# Altium footprint library Module MISC.PcbLib: 27 footprints (part 2 of 2)
Each footprint in its own frame and in the unit in brackets; x right, y up, seen from the top. Pads: shape width x height; smd on the part's side, far side on the other; paste and mask are expansions set on the pad; w line width, h text height; cw(c..) or ccw(c..) is an arc to the next point about the centre after c.
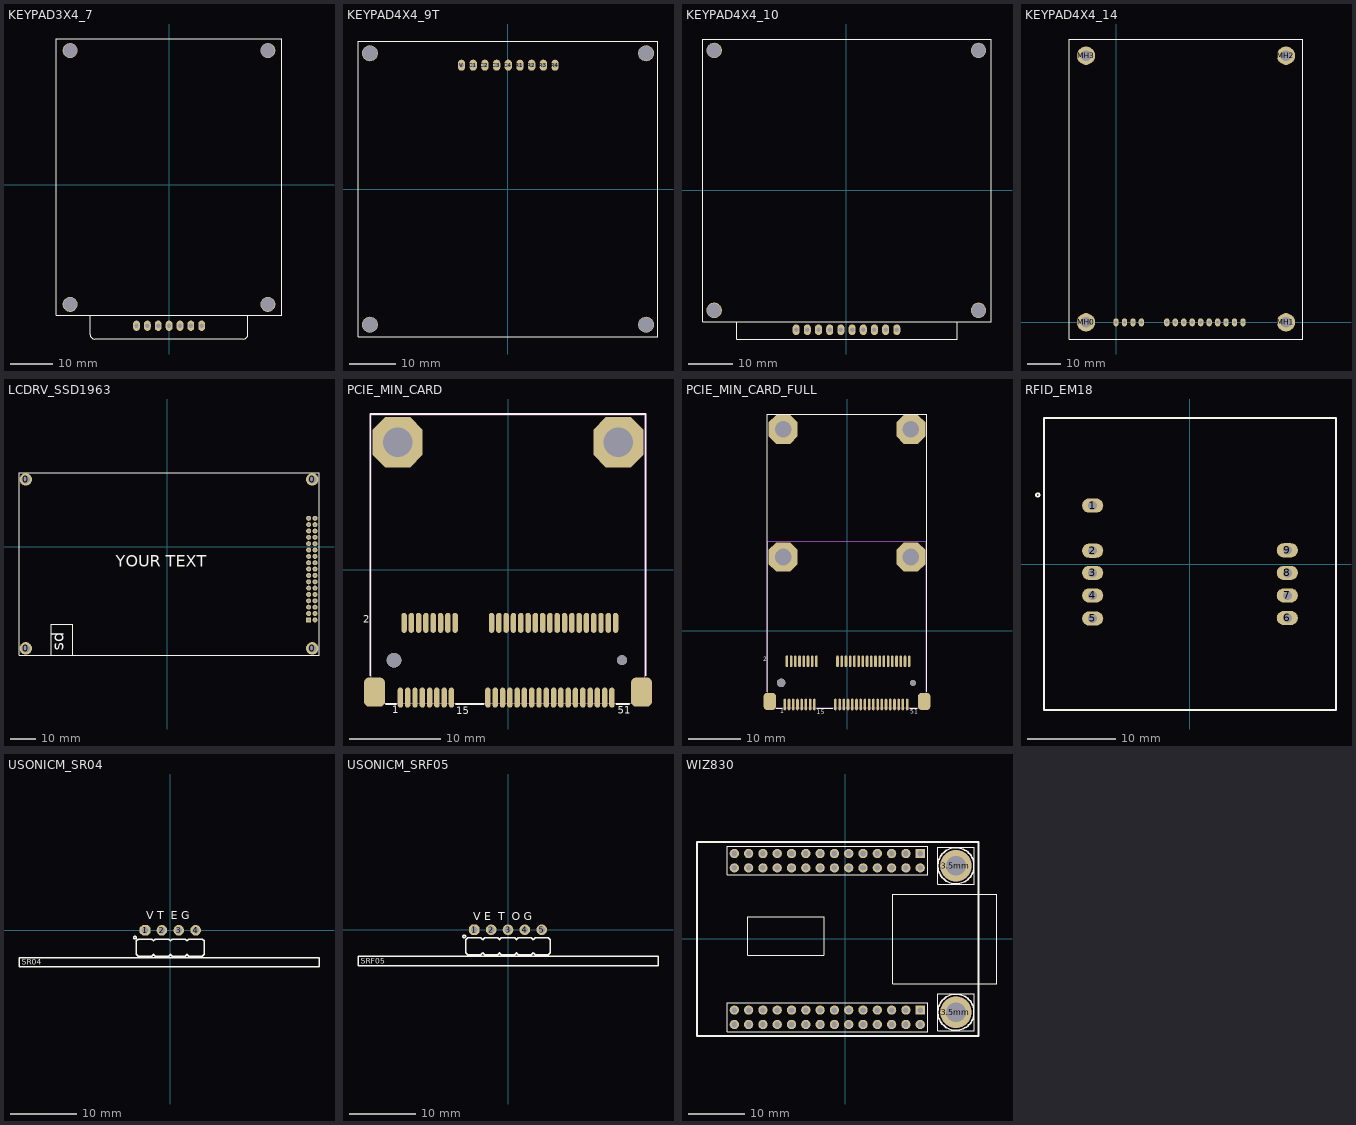
[diagram p1: the footprints below, top view; thin cyan lines are the x and y axes]

## KEYPAD3X4_7 [mm] "Matrix Keyboard 4x4"
pads (11):
  oval 1.6x2.4 hole 1: C1(-7.6,-32.9) C2(-5.06,-32.9) C3(-2.52,-32.9) R1(0.02,-32.9) R2(2.56,-32.9) R3(5.1,-32.9) R4(7.64,-32.9)
  round 3.5 / inner round 3.5 / far side round 5.5 hole 3.2: ""(-23.1,-27.9) ""(-23.1,31.4) ""(23.1,-27.9) ""(23.1,31.4)
Top Overlay:
  lines w0.2: -18.4,-30.4 -18.4,-35 ccw(c-17.4,-35) -17.4,-36 17.4,-36 ccw(c17.4,-35) 18.4,-35 18.4,-30.4 ; -26.3,-30.4 26.3,-30.4 26.3,34.1 -26.3,34.1 -26.3,-30.4
3D body "User Library-Keypad 3x4.step": height 10.8, standoff -12, extent -26.175,-35.8 26.176,33.95

## KEYPAD4X4_9T [mm] "Matrix Keyboard 4x4"
pads (13):
  oval 1.6x2.4 hole 1: C1(-7.56,26.9) C2(-5.02,26.9) C3(-2.48,26.9) C4(0.06,26.9) R1(2.6,26.9) R2(5.14,26.9) R3(7.68,26.9) R4(10.22,26.9) V(-10.1,26.9)
  round 3.5 / inner round 3.5 / far side round 5.5 hole 3.2: ""(-30,-29.5) ""(-30,29.5) ""(30,-29.5) ""(30,29.5)
Top Overlay:
  lines w0.2: -32.6,-32.1 32.6,-32.1 32.6,32.1 -32.6,32.1 -32.6,-32.1
3D body "43128.stp": height 13.17, standoff -7.7, extent -32.5,-32 32.5,32

## KEYPAD4X4_10 [mm] "Matrix Keyboard 4x4"
pads (14):
  oval 1.6x2.4 hole 1: C1(-8.86,-31.7) C2(-6.32,-31.7) C3(-3.78,-31.7) C4(-1.24,-31.7) R1(1.3,-31.7) R2(3.84,-31.7) R3(6.38,-31.7) R4(8.92,-31.7) ""(-11.4,-31.7) ""(11.46,-31.7)
  round 3.5 / inner round 3.5 / far side round 5.5 hole 3.2: ""(-30,-27.3) ""(-30,31.7) ""(30,-27.3) ""(30,31.7)
Top Overlay:
  lines w0.2: -24.9,-29.9 -24.9,-33.8 25.2,-33.8 25.2,-29.9 ; -32.6,-29.9 -32.6,34.3 32.9,34.3 32.9,-29.9 -32.6,-29.9
3D body "User Library-Keypad 4x4.step": height 12.08, standoff 2.68, extent -32.539,-33.6 32.739,34.218

## KEYPAD4X4_14 [mm] "Matrix Keyboard 4x4"
pads (18):
  oval 1.6x2.4 hole 1: C1(17.78,0) C2(20.32,0) C3(22.86,0) C4(25.4,0) COM(38.1,0) L1(27.94,0) L2(30.48,0) L3(33.02,0) L4(35.56,0) R1(0,0) R2(2.54,0) R3(5.08,0) R4(7.62,0) V(15.24,0)
  round 5.5 hole 3.2: MH0(-9,0) MH1(51,0) MH2(51,80) MH3(-9,80)
Top Overlay:
  lines w0.2: -14,-5 -14,85 56,85 56,-5 -14,-5
3D body "header04-15mm.STEP": height 18.03, standoff -2.54, extent -1.27,-1.27 8.89,1.27
3D body "header10-15mm.STEP": height 18.03, standoff -2.54, extent 13.97,-1.27 39.37,1.27
3D body "Spacer.STEP": height 15, standoff -5, extent -11.858,77.525 -6.142,82.475
3D body "Spacer.STEP": height 15, standoff -5, extent -11.858,-2.475 -6.142,2.475
3D body "Spacer.STEP": height 15, standoff -5, extent 48.142,-2.475 53.858,2.475
3D body "Spacer.STEP": height 15, standoff -5, extent 48.142,77.525 53.858,82.475
3D body "Keyboard.STEP": height 22.22, standoff 15, extent -14,-5 56,85

## LCDRV_SSD1963 [mm] "SSD1963 Module.3 Or 5 Inch"
pads (38):
  round 5 hole 3.2: 0(-56.6,-40.7) 0(-56.6,26.9) 0(58,-40.7) 0(58,26.9)
  rect 2x2 hole 0.9: 1(56.56,-29.3)
  round 2 hole 0.9: 2(59.1,-29.3) 3(56.56,-26.76) 4(59.1,-26.76) 5(56.56,-24.22) 6(59.1,-24.22) 7(56.56,-21.68) 8(59.1,-21.68) 9(56.56,-19.14) 10(59.1,-19.14) 11(56.56,-16.6) 12(59.1,-16.6) 13(56.56,-14.06) 14(59.1,-14.06) 15(56.56,-11.52) 16(59.1,-11.52) 17(56.56,-8.98) 18(59.1,-8.98) 19(56.56,-6.44) 20(59.1,-6.44) 21(56.56,-3.9) 22(59.1,-3.9) 23(56.56,-1.36) 24(59.1,-1.36) 25(56.56,1.18) 26(59.1,1.18) 27(56.56,3.72) 28(59.1,3.72) 29(56.56,6.26) 30(59.1,6.26) 31(56.56,8.8) 32(59.1,8.8) 33(56.56,11.34) 34(59.1,11.34)
Top Overlay:
  lines w0.2: -38,-31 -37.9,-31 ; -37.9,-31 -37.9,-43.5 -46.4,-43.5 -46.4,-31 -37.9,-31
  lines w0.5: -59.3,-43.4 -59.3,29.6 60.7,29.6 60.7,-43.4 -59.3,-43.4
  text "YOUR TEXT" at -20.7,-9.6 h8
  text "sd" at -39.9,-41.7 h8
3D body "Header 6.STEP": height 9.54, standoff -2, extent 57.86,-30.59 60.35,-15.35
3D body "Header 10.STEP": height 9.54, standoff -2, extent 57.86,-15.35 60.35,10.05
3D body "Header 6.STEP": height 9.54, standoff -2, extent 55.32,-30.59 57.81,-15.35
3D body "Header 10.STEP": height 9.54, standoff -2, extent 55.32,-15.35 57.81,10.05
3D body "Header 2.STEP": height 9.54, standoff -2, extent 55.29,10.14 60.37,12.63
3D body "Header 6.STEP": height 9.54, standoff -2, extent -56.4,-30.69 -53.91,-15.45
3D body "Header 10.STEP": height 9.54, standoff -2, extent -56.4,-15.45 -53.91,9.95
3D body "Header 6.STEP": height 9.54, standoff -2, extent -58.94,-30.69 -56.45,-15.45
3D body "Header 10.STEP": height 9.54, standoff -2, extent -58.94,-15.45 -56.45,9.95
3D body "Header 2.STEP": height 9.54, standoff -2, extent -58.97,10.04 -53.89,12.53

## PCIE_MIN_CARD [mm] "PCIE_MINI_CARD molex 679100002"
height 4
pads (58):
  oval 0.6x2.2 smd: 1(-11.8,-14) 2(-11.4,-5.8) 3(-11,-14) 4(-10.6,-5.8) 5(-10.2,-14) 6(-9.8,-5.8) 7(-9.4,-14) 8(-9,-5.8) 9(-8.6,-14) 10(-8.2,-5.8) 11(-7.8,-14) 12(-7.4,-5.8) 13(-7,-14) 14(-6.6,-5.8) 15(-6.2,-14) 16(-5.8,-5.8) 17(-2.2,-14) 18(-1.8,-5.8) 19(-1.4,-14) 20(-1,-5.8) 21(-0.6,-14) 22(-0.2,-5.8) 23(0.2,-14) 24(0.6,-5.8) 25(1,-14) 26(1.4,-5.8) 27(1.8,-14) 28(2.2,-5.8) 29(2.6,-14) 30(3,-5.8) 31(3.4,-14) 32(3.8,-5.8) 33(4.2,-14) 34(4.6,-5.8) 35(5,-14) 36(5.4,-5.8) 37(5.8,-14) 38(6.2,-5.8) 39(6.6,-14) 40(7,-5.8) 41(7.4,-14) 42(7.8,-5.8) 43(8.2,-14) 44(8.6,-5.8) 45(9,-14) 46(9.4,-5.8) 47(9.8,-14) 48(10.2,-5.8) 49(10.6,-14) 50(11,-5.8) 51(11.4,-14) 52(11.8,-5.8)
  rrect50% 2.311x3.2 smd: " "(-14.65,-13.4) " "(14.65,-13.4)
  round 1.6 hole 1.6 unplated: " "(-12.5,-9.9)
  oct 5.5x5.5 hole 3.2: " "(-12.1,14) " "(12.1,14)
  round 1.1 hole 1.1 unplated: " "(12.5,-9.9)
Top Overlay:
  lines w0.2: -15.1,-11.6 -15.1,17.1 15.1,17.1 15.1,-11.6 ; -13.4,-14.7 -12.3,-14.7 ; -5.7,-14.7 -2.7,-14.7 ; 11.9,-14.7 13.3,-14.7
  text "1" at -12.7,-15.7 h0.8
  text "2" at -15.9,-5.8 h0.8
  text "51" at 12.011,-15.763 h0.8
  text "15" at -5.7,-15.8 h0.8
Top Solder:
  pour cut-out: 11.756,-15.054 11.756,-12.946 -2.556,-12.946 -2.556,-15.054
  pour cut-out: -5.844,-15.054 -5.844,-12.946 -12.156,-12.946 -12.156,-15.054
  pour cut-out: -5.444,-6.854 -5.444,-4.746 -11.756,-4.746 -11.756,-6.854
  pour cut-out: 12.156,-6.854 12.156,-4.746 -2.156,-4.746 -2.156,-6.854
Mechanical 13:
  lines w0.1: -15,-14.6 15,-14.6 15,17 -15,17 -15,-14.6
3D body "K3D-MM60-52B1-E1-R2 JAE Connector Division Proprietary.STEP": height 5.95, standoff -0.75, extent -14.85,-14.9 14.85,-4.9
3D body: height 4, standoff 0, extent -15,-14.6 15,17

## PCIE_MIN_CARD_FULL [mm] "PCIE_MINI_CARD molex 679100002"
height 4
pads (60):
  oval 0.5x2.2 smd mask+0.075: 1(-11.8,-14) 2(-11.4,-5.8) 3(-11,-14) 4(-10.6,-5.8) 5(-10.2,-14) 6(-9.8,-5.8) 7(-9.4,-14) 8(-9,-5.8) 9(-8.6,-14) 10(-8.2,-5.8) 11(-7.8,-14) 12(-7.4,-5.8) 13(-7,-14) 14(-6.6,-5.8) 15(-6.2,-14) 16(-5.8,-5.8) 17(-2.2,-14) 18(-1.8,-5.8) 19(-1.4,-14) 20(-1,-5.8) 21(-0.6,-14) 22(-0.2,-5.8) 23(0.2,-14) 24(0.6,-5.8) 25(1,-14) 26(1.4,-5.8) 27(1.8,-14) 28(2.2,-5.8) 29(2.6,-14) 30(3,-5.8) 31(3.4,-14) 32(3.8,-5.8) 33(4.2,-14) 34(4.6,-5.8) 35(5,-14) 36(5.4,-5.8) 37(5.8,-14) 38(6.2,-5.8) 39(6.6,-14) 40(7,-5.8) 41(7.4,-14) 42(7.8,-5.8) 43(8.2,-14) 44(8.6,-5.8) 45(9,-14) 46(9.4,-5.8) 47(9.8,-14) 48(10.2,-5.8) 49(10.6,-14) 50(11,-5.8) 51(11.4,-14) 52(11.8,-5.8)
  rrect50% 2.311x3.2 smd: " "(-14.65,-13.4) " "(14.65,-13.4)
  round 1.6 hole 1.6 unplated: " "(-12.5,-9.9)
  round 1.1 hole 1.1 unplated: " "(12.5,-9.9)
  oct 5.5x5.5 hole 3.2 unplated: ""(-12.1,14) ""(-12.1,38.2) ""(12.1,14) ""(12.1,38.2)
Top Overlay:
  lines w0.2: -15.1,-11.6 -15.1,41.1 15.1,41.1 15.1,-11.6 ; -13.4,-14.7 -12.3,-14.7 ; -5.7,-14.7 -2.7,-14.7 ; 11.9,-14.7 13.3,-14.7
  text "15" at -5.7,-15.8 h0.8
  text "51" at 12.011,-15.763 h0.8
  text "2" at -15.9,-5.8 h0.8
  text "1" at -12.7,-15.7 h0.8
Mechanical 13:
  lines w0.1: -15,-14.6 -15,17 15,17 15,-14.6 -15,-14.6
3D body "User Library-PCI Express Mini Card (Full-Mini Card).step": height 4.8, standoff 0.05, extent -15,-9.9 15,41.05
3D body "K3D-MM60-52B1-E1-R2 JAE Connector Division Proprietary.STEP": height 5.95, standoff -0.75, extent -14.85,-14.9 14.85,-4.9

## RFID_EM18 [mm] "MODULE, RFID Reader, EM-18"
pads (9):
  oval 2.4x1.6 hole 1: 1(-11,6.65) 2(-11,1.55) 3(-11,-0.95) 4(-11,-3.5) 5(-11,-6.1) 6(11,-6.05) 7(11,-3.5) 8(11,-0.95) 9(11,1.6)
Top Overlay:
  circle w0.2: c-17.2,7.849 r0.2
  lines w0.2: -16.5,-16.45 16.5,-16.45 16.5,16.45 16.5,16.55 -16.5,16.55 -16.5,-16.45
3D body "User Library-EM-18.STEP": height 8.05, standoff -6.1, extent -16.5,-16.45 16.5,16.55

## USONICM_SR04 [mm] "Ultrasonic sensor Module, HC-SR04"
pads (4):
  oct 1.6x1.6 / inner oct 1.6x1.6 / far side oct 1.6x2.2 hole 1 mask+0.1: 1(-3.81,0)
  round 1.6 / inner round 1.6 / far side oval 1.6x2.2 hole 1 mask+0.1: 2(-1.27,0) 3(1.27,0) 4(3.81,0)
Top Overlay:
  circle w0.2: c-5.33,-1.1 r0.2
  lines w0.2: -2.57,-3.6 -2.27,-3.9 -0.27,-3.9 0.03,-3.6 ; -2.57,-1.6 -2.27,-1.3 -0.27,-1.3 0.03,-1.6 ; -2.51,-3.6 -2.81,-3.9 -4.81,-3.9 -5.11,-3.6 -5.11,-1.6 -4.81,-1.3 -2.81,-1.3 -2.51,-1.6 ; -0.03,-3.6 0.27,-3.9 2.27,-3.9 2.57,-3.6 ; -0.03,-1.6 0.27,-1.3 2.27,-1.3 2.57,-1.6 ; 2.51,-3.6 2.81,-3.9 4.81,-3.9 ; 2.51,-1.6 2.81,-1.3 4.81,-1.3 ; 4.81,-3.9 5.11,-3.6 ; 4.81,-3.9 5.11,-3.6 ; 4.81,-1.3 5.11,-1.6 ; 4.81,-1.3 5.11,-1.6 ; 5.11,-3.6 5.11,-1.6 ; -22.8,-5.5 -22.8,-4.1 22.4,-4.1 22.4,-5.5 -22.8,-5.5
  text "SR04" at -22.4,-5.2 h0.8
  text "V T  E G" at -3.63,1.7 h1.2
3D body "HC-SR04_User Library.STEP": height 20.6, standoff -4.58, extent -22.7,-17.8 22.3,0.268

## USONICM_SRF05 [mm] "Ultrasonic sensor Module, SRF05"
pads (5):
  oct 1.6x1.6 / inner oct 1.6x1.6 / far side oct 1.6x2.2 hole 1 mask+0.1: 1(-5.08,0)
  round 1.6 / inner round 1.6 / far side oval 1.6x2.2 hole 1 mask+0.1: 2(-2.54,0) 3(0,0) 4(2.54,0) 5(5.08,0)
Top Overlay:
  circle w0.2: c-6.6,-1 r0.2
  lines w0.2: -3.84,-3.5 -3.54,-3.8 -1.54,-3.8 -1.24,-3.5 ; -3.84,-1.5 -3.54,-1.2 -1.54,-1.2 -1.24,-1.5 ; -3.78,-3.5 -4.08,-3.8 -6.08,-3.8 -6.38,-3.5 -6.38,-1.5 -6.08,-1.2 -4.08,-1.2 -3.78,-1.5 ; -1.3,-3.5 -1,-3.8 1,-3.8 1.3,-3.5 ; -1.3,-1.5 -1,-1.2 1,-1.2 1.3,-1.5 ; 1.24,-3.5 1.54,-3.8 3.54,-3.8 3.84,-3.5 ; 1.24,-1.5 1.54,-1.2 3.54,-1.2 3.84,-1.5 ; 3.78,-3.5 4.08,-3.8 6.08,-3.8 6.38,-3.5 6.38,-1.5 6.08,-1.2 4.08,-1.2 3.78,-1.5 ; -22.6,-5.4 -22.6,-4 22.6,-4 22.6,-5.4 -22.6,-5.4
  text "V E  T  O G" at -5.2,1.4 h1.2
  text "SRF05" at -22.2,-5.1 h0.8
3D body "HY-SRF05_v3.stp": height 20.3, standoff -6.3, extent -22.5,-17.7 22.5,0.327

## WIZ830 [mil]
pads (58):
  round 220.47 hole 137.8: 3.5mm(775,-512.3) 3.5mm(775,512.1)
  rect 65x65 hole 39.37: J1-1(525,597.7) J2-1(525,-497.3)
  round 65 hole 39.37: J1-2(525,497.3) J1-3(425,597.7) J1-4(425,497.3) J1-5(325,597.7) J1-6(325,497.3) J1-7(225,597.7) J1-8(225,497.3) J1-9(125,597.7) J1-10(125,497.3) J1-11(25,597.7) J1-12(25,497.3) J1-13(-75,597.7) J1-14(-75,497.3) J1-15(-175,597.7) J1-16(-175,497.3) J1-17(-275,597.7) J1-18(-275,497.3) J1-19(-375,597.7) J1-20(-375,497.3) J1-21(-475,597.7) J1-22(-475,497.3) J1-23(-575,597.7) J1-24(-575,497.3) J1-25(-675,597.7) J1-26(-675,497.3) J1-27(-775,597.7) J1-28(-775,497.3) J2-2(525,-597.7) J2-3(425,-497.3) J2-4(425,-597.7) J2-5(325,-497.3) J2-6(325,-597.7) J2-7(225,-497.3) J2-8(225,-597.7) J2-9(125,-497.3) J2-10(125,-597.7) J2-11(25,-497.3) J2-12(25,-597.7) J2-13(-75,-497.3) J2-14(-75,-597.7) J2-15(-175,-497.3) J2-16(-175,-597.7) J2-17(-275,-497.3) J2-18(-275,-597.7) J2-19(-375,-497.3) J2-20(-375,-597.7) J2-21(-475,-497.3) J2-22(-475,-597.7) J2-23(-575,-497.3) J2-24(-575,-597.7) J2-25(-675,-497.3) J2-26(-675,-597.7) J2-27(-775,-497.3) J2-28(-775,-597.7)
Top Overlay:
  circle w10: c775,-512.3 r125.98
  circle w5: c774.52,-512.27 r59.06
  circle w5: c774.52,511.35 r59.06
  circle w10: c775,512.1 r125.98
  lines w5: -682.17,-113.57 -682.17,157.02 -150.68,157.02 -150.68,-113.57 -682.17,-113.57 ; 333.57,-313.45 1061.92,-313.45 1061.92,312.54 333.57,312.54 333.57,-313.45
  lines w7.87: -823.4,-647.3 576.6,-647.3 576.6,-447.3 -823.4,-447.3 -823.4,-647.3 ; -823.4,447.7 -823.4,647.7 576.6,647.7 576.6,447.7 -823.4,447.7 ; 647,-640.3 647,-384.3 903,-384.3 903,-640.3 647,-640.3 ; 647,384.1 903,384.1 903,640.1 647,640.1 647,384.1
  lines w11.81: -1036,-679.04 -1036,678.84 932,678.84 932,-679.04 -1036,-679.04
Keep-Out Layer:
  circle w39.37: c775,512.1 r78.74
Mechanical 7:
  circle w3.94: c775,512.18 r106.3
  circle w47.24: c775,512.1 r86.61
  circle w3.94: c775,-512.38 r106.3
  region: 755.28,575.09 711.97,575.09 711.97,543.59 755.28,543.59
  region: 743.49,531.76 743.49,575.07 712,575.07 712,531.76
  region: 733.03,565.85 721.22,554.04 743.49,531.76 755.3,543.58
  region: 837.98,531.76 837.98,575.07 806.48,575.07 806.48,531.76
  rectangle: 794.67,543.57 837.98,575.06
  region: 828.73,554.05 816.92,565.86 794.65,543.59 806.46,531.78
  rectangle: 794.67,449.09 837.98,480.58
  region: 816.9,458.3 828.71,470.11 806.44,492.38 794.63,480.57
  region: 712,492.39 712,449.09 743.49,449.09 743.49,492.39
  region: 755.3,480.58 712,480.58 712,449.09 755.3,449.09
  region: 721.22,470.14 733.03,458.33 755.3,480.6 743.49,492.41
  region: 743.47,-492.63 755.29,-480.82 733.01,-458.55 721.2,-470.36
  region: 755.31,-449.31 712,-449.31 712,-480.81 755.31,-480.81
  region: 743.49,-492.61 743.49,-449.31 712,-449.31 712,-492.61
  region: 794.65,-480.8 806.46,-492.61 828.73,-470.34 816.92,-458.53
  rectangle: 794.67,-480.82 837.98,-449.32
  region: 806.48,-531.99 794.67,-543.8 816.94,-566.07 828.75,-554.26
  rectangle: 794.67,-575.29 837.98,-543.8
  region: 806.48,-531.99 806.48,-575.3 837.98,-575.3 837.98,-531.99
  region: 755.31,-543.8 743.5,-531.99 721.23,-554.26 733.04,-566.07
  region: 712,-531.98 712,-575.29 743.49,-575.29 743.49,-531.98
  region: 755.3,-543.79 712,-543.79 712,-575.29 755.3,-575.29